# Altium footprint library DrPCB.PcbLib: 910 footprints (part 51 of 57)
Each footprint in its own frame and in the unit in brackets; x right, y up, seen from the top. Pads: shape width x height; smd on the part's side, far side on the other; paste and mask are expansions set on the pad; w line width, h text height; cw(c..) or ccw(c..) is an arc to the next point about the centre after c.
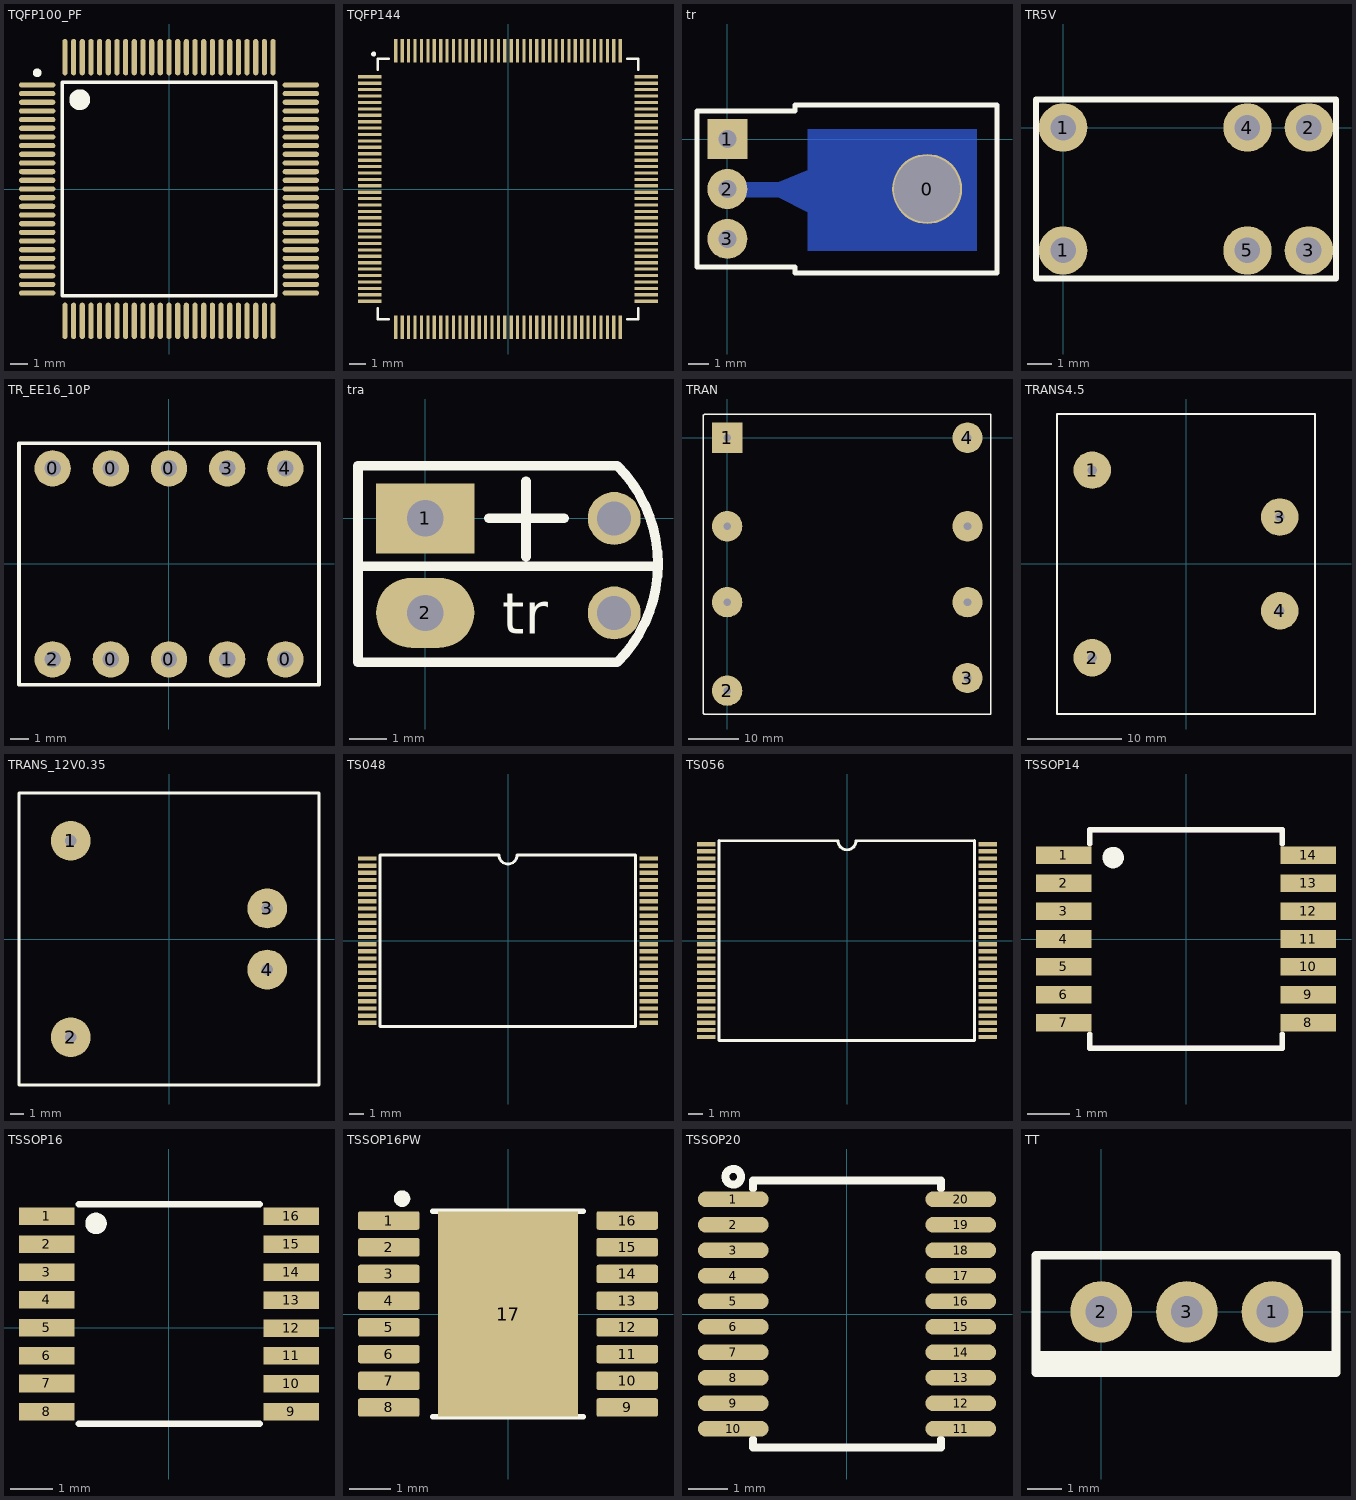
[diagram p50: the footprints below, top view; thin cyan lines are the x and y axes]

## TQFP100_PF [mm]
pads (100):
  oval 2.1x0.3 smd: 1(-7.6,6) 2(-7.6,5.5) 3(-7.6,5) 4(-7.6,4.5) 5(-7.6,4) 6(-7.6,3.5) 7(-7.6,3) 8(-7.6,2.5) 9(-7.6,2) 10(-7.6,1.5) 11(-7.6,1) 12(-7.6,0.5) 13(-7.6,0) 14(-7.6,-0.5) 15(-7.6,-1) 16(-7.6,-1.5) 17(-7.6,-2) 18(-7.6,-2.5) 19(-7.6,-3) 20(-7.6,-3.5) 21(-7.6,-4) 22(-7.6,-4.5) 23(-7.6,-5) 24(-7.6,-5.5) 25(-7.6,-6) 51(7.6,-6) 52(7.6,-5.5) 53(7.6,-5) 54(7.6,-4.5) 55(7.6,-4) 56(7.6,-3.5) 57(7.6,-3) 58(7.6,-2.5) 59(7.6,-2) 60(7.6,-1.5) 61(7.6,-1) 62(7.6,-0.5) 63(7.6,0) 64(7.6,0.5) 65(7.6,1) 66(7.6,1.5) 67(7.6,2) 68(7.6,2.5) 69(7.6,3) 70(7.6,3.5) 71(7.6,4) 72(7.6,4.5) 73(7.6,5) 74(7.6,5.5) 75(7.6,6)
  oval 0.3x2.1 smd: 26(-6,-7.6) 27(-5.5,-7.6) 28(-5,-7.6) 29(-4.5,-7.6) 30(-4,-7.6) 31(-3.5,-7.6) 32(-3,-7.6) 33(-2.5,-7.6) 34(-2,-7.6) 35(-1.5,-7.6) 36(-1,-7.6) 37(-0.5,-7.6) 38(0,-7.6) 39(0.5,-7.6) 40(1,-7.6) 41(1.5,-7.6) 42(2,-7.6) 43(2.5,-7.6) 44(3,-7.6) 45(3.5,-7.6) 46(4,-7.6) 47(4.5,-7.6) 48(5,-7.6) 49(5.5,-7.6) 50(6,-7.6) 76(6,7.6) 77(5.5,7.6) 78(5,7.6) 79(4.5,7.6) 80(4,7.6) 81(3.5,7.6) 82(3,7.6) 83(2.5,7.6) 84(2,7.6) 85(1.5,7.6) 86(1,7.6) 87(0.5,7.6) 88(0,7.6) 89(-0.5,7.6) 90(-1,7.6) 91(-1.5,7.6) 92(-2,7.6) 93(-2.5,7.6) 94(-3,7.6) 95(-3.5,7.6) 96(-4,7.6) 97(-4.5,7.6) 98(-5,7.6) 99(-5.5,7.6) 100(-6,7.6)
Top Overlay:
  circle w0.6: c-5.15,5.15 r0.3
  circle w0.25: c-7.6,6.7 r0.125
  lines w0.2: -6.15,-6.15 6.15,-6.15 6.15,6.15 -6.15,6.15 -6.15,-6.15

## TQFP144 [mil]
pads (144):
  rect 58x7.87 smd: 1(-339.5,275.59) 2(-339.5,259.84) 3(-339.5,244.09) 4(-339.5,228.35) 5(-339.5,212.6) 6(-339.5,196.85) 7(-339.5,181.1) 8(-339.5,165.35) 9(-339.5,149.61) 10(-339.5,133.86) 11(-339.5,118.11) 12(-339.5,102.36) 13(-339.5,86.61) 14(-339.5,70.87) 15(-339.5,55.12) 16(-339.5,39.37) 17(-339.5,23.62) 18(-339.5,7.87) 19(-339.5,-7.87) 20(-339.5,-23.62) 21(-339.5,-39.37) 22(-339.5,-55.12) 23(-339.5,-70.87) 24(-339.5,-86.61) 25(-339.5,-102.36) 26(-339.5,-118.11) 27(-339.5,-133.86) 28(-339.5,-149.61) 29(-339.5,-165.35) 30(-339.5,-181.1) 31(-339.5,-196.85) 32(-339.5,-212.6) 33(-339.5,-228.35) 34(-339.5,-244.09) 35(-339.5,-259.84) 36(-339.5,-275.59) 73(339.5,-275.59) 74(339.5,-259.84) 75(339.5,-244.09) 76(339.5,-228.35) 77(339.5,-212.6) 78(339.5,-196.85) 79(339.5,-181.1) 80(339.5,-165.35) 81(339.5,-149.61) 82(339.5,-133.86) 83(339.5,-118.11) 84(339.5,-102.36) 85(339.5,-86.61) 86(339.5,-70.87) 87(339.5,-55.12) 88(339.5,-39.37) 89(339.5,-23.62) 90(339.5,-7.87) 91(339.5,7.87) 92(339.5,23.62) 93(339.5,39.37) 94(339.5,55.12) 95(339.5,70.87) 96(339.5,86.61) 97(339.5,102.36) 98(339.5,118.11) 99(339.5,133.86) 100(339.5,149.61) 101(339.5,165.35) 102(339.5,181.1) 103(339.5,196.85) 104(339.5,212.6) 105(339.5,228.35) 106(339.5,244.09) 107(339.5,259.84) 108(339.5,275.59)
  rect 7.87x58 smd: 37(-275.59,-339.5) 38(-259.84,-339.5) 39(-244.09,-339.5) 40(-228.35,-339.5) 41(-212.6,-339.5) 42(-196.85,-339.5) 43(-181.1,-339.5) 44(-165.35,-339.5) 45(-149.61,-339.5) 46(-133.86,-339.5) 47(-118.11,-339.5) 48(-102.36,-339.5) 49(-86.61,-339.5) 50(-70.87,-339.5) 51(-55.12,-339.5) 52(-39.37,-339.5) 53(-23.62,-339.5) 54(-7.87,-339.5) 55(7.87,-339.5) 56(23.62,-339.5) 57(39.37,-339.5) 58(55.12,-339.5) 59(70.87,-339.5) 60(86.61,-339.5) 61(102.36,-339.5) 62(118.11,-339.5) 63(133.86,-339.5) 64(149.61,-339.5) 65(165.35,-339.5) 66(181.1,-339.5) 67(196.85,-339.5) 68(212.6,-339.5) 69(228.35,-339.5) 70(244.09,-339.5) 71(259.84,-339.5) 72(275.59,-339.5) 109(275.59,339.5) 110(259.84,339.5) 111(244.09,339.5) 112(228.35,339.5) 113(212.6,339.5) 114(196.85,339.5) 115(181.1,339.5) 116(165.35,339.5) 117(149.61,339.5) 118(133.86,339.5) 119(118.11,339.5) 120(102.36,339.5) 121(86.61,339.5) 122(70.87,339.5) 123(55.12,339.5) 124(39.37,339.5) 125(23.62,339.5) 126(7.87,339.5) 127(-7.87,339.5) 128(-23.62,339.5) 129(-39.37,339.5) 130(-55.12,339.5) 131(-70.87,339.5) 132(-86.61,339.5) 133(-102.36,339.5) 134(-118.11,339.5) 135(-133.86,339.5) 136(-149.61,339.5) 137(-165.35,339.5) 138(-181.1,339.5) 139(-196.85,339.5) 140(-212.6,339.5) 141(-228.35,339.5) 142(-244.09,339.5) 143(-259.84,339.5) 144(-275.59,339.5)
Top Overlay:
  circle w10: c-330,331.5 r1.12
  lines w6: -320,-293.19 -320,-320 -293.19,-320 ; -320,293.19 -320,320 -293.19,320 ; 293.19,-320 320,-320 320,-293.19 ; 293.19,320 320,320 320,293.19
3D body "User Library-TQFP144-0_4.STEP": height 47.24, standoff 0, extent -354.33,-354.33 354.33,354.33

## tr [mm]
pads (4):
  round 3.5 hole 3.3: 0(10,-2.5)
  rect 2x2 hole 0.9: 1(0,0)
  round 2 hole 0.9: 2(0,-2.5) 3(0,-5)
Bottom Layer:
  rectangle: 4,-5.6 12.5,0.5
  region: 4.064,-1.524 2.54,-2.159 0,-2.159 0,-2.921 2.54,-2.921 4.064,-3.683
Top Overlay:
  lines w0.254: -1.524,-6.397 -1.524,1.397 3.38,1.397 3.38,1.7 13.5,1.7 13.5,-6.7 3.38,-6.7 3.38,-6.397 -1.477,-6.397

## TR5V [mm]
pads (6):
  round 2 hole 1.05: 1(0,-5.08) 1(0,0) 2(10.16,0) 3(10.16,-5.08) 4(7.62,0) 5(7.62,-5.08)
Top Overlay:
  lines w0.254: -1.12,-6.24 -1.12,1.16 11.28,1.16 11.28,-6.24 -1.12,-6.24

## TR_EE16_10P [mm]
pads (10):
  round 2 hole 0.9: 0(-6.4,5.25) 0(-3.2,-5.25) 0(-3.2,5.25) 0(0,-5.25) 0(0,5.25) 0(6.4,-5.25) 1(3.2,-5.25) 2(-6.4,-5.25) 3(3.2,5.25) 4(6.4,5.25)
Top Overlay:
  lines w0.2: -8.25,-6.642 -8.25,6.629 8.25,6.629 8.25,-6.642 -8.25,-6.642
3D body "User Library-EE16(5+5).step": height 14.95, standoff -3.6, extent -8.1,-6.462 8.1,6.462

## tra [mm]
pads (4):
  rect 2.6x1.85 hole 0.96: 1(0,0)
  oval 2.6x1.85 hole 0.96: 2(0,-2.5)
  round 1.4 hole 0.9: ""(5,-2.5) ""(5,0)
Top Overlay:
  lines w0.254: -1.778,-1.27 6.096,-1.27 ; 1.683,0 3.683,0 ; 2.667,-1.016 2.667,0.984 ; -1.778,-3.81 -1.778,1.397 5.08,1.397 cw(c2.476,-1.206) 5.08,-3.81 -1.778,-3.81
  text "tr" at 2.032,-3.048 h1.1

## TRAN [mm]
pads (8):
  rect 6x6 hole 1.5: 1(0,0)
  round 6 hole 1.5: 2(0,-50) 3(47.5,-47.5) 4(47.5,0) ""(0,-32.5) ""(0,-17.5) ""(47.5,-32.5) ""(47.5,-17.5)
Top Overlay:
  lines w0.254: -4.699,-54.483 -4.699,4.445 -4.445,4.699 52.07,4.699 52.07,-54.61 -4.572,-54.61 -4.699,-54.483

## TRANS4.5 [mm]
pads (4):
  round 4 hole 1: 1(-10,10) 2(-10,-10) 3(10,5) 4(10,-5)
Top Overlay:
  lines w0.254: -13.75,-16 -13.75,15.982 13.75,15.982 13.75,-16 -13.683,-16

## TRANS_12V0.35 [mm]
pads (4):
  round 3 hole 0.85: 1(-7.4,7.4) 2(-7.4,-7.4) 3(7.4,2.3) 4(7.4,-2.3)
Top Overlay:
  lines w0.254: 11.29,-11 -11.3,-11 -11.3,11 11.29,11 ; 11.3,-11 11.3,11
3D body "70904490.stp": height 19, standoff -5, extent -11.3,-10.85 11.3,10.85

## TS048 [mm]
pads (48):
  rect 1.3x0.3 smd: 1(-9.85,5.75) 2(-9.85,5.25) 3(-9.85,4.75) 4(-9.85,4.25) 5(-9.85,3.75) 6(-9.85,3.25) 7(-9.85,2.75) 8(-9.85,2.25) 9(-9.85,1.75) 10(-9.85,1.25) 11(-9.85,0.75) 12(-9.85,0.25) 13(-9.85,-0.25) 14(-9.85,-0.75) 15(-9.85,-1.25) 16(-9.85,-1.75) 17(-9.85,-2.25) 18(-9.85,-2.75) 19(-9.85,-3.25) 20(-9.85,-3.75) 21(-9.85,-4.25) 22(-9.85,-4.75) 23(-9.85,-5.25) 24(-9.85,-5.75) 25(9.85,-5.75) 26(9.85,-5.25) 27(9.85,-4.75) 28(9.85,-4.25) 29(9.85,-3.75) 30(9.85,-3.25) 31(9.85,-2.75) 32(9.85,-2.25) 33(9.85,-1.75) 34(9.85,-1.25) 35(9.85,-0.75) 36(9.85,-0.25) 37(9.85,0.25) 38(9.85,0.75) 39(9.85,1.25) 40(9.85,1.75) 41(9.85,2.25) 42(9.85,2.75) 43(9.85,3.25) 44(9.85,3.75) 45(9.85,4.25) 46(9.85,4.75) 47(9.85,5.25) 48(9.85,5.75)
Top Overlay:
  lines w0.2: 8.915,5.999 0.635,5.999 cw(c0,5.999) -0.635,5.999 -8.966,5.999 -8.966,-5.997 8.928,-5.997 8.928,6

## TS056 [mm]
pads (56):
  rect 1.3x0.3 smd: 1(-9.85,6.75) 2(-9.85,6.25) 3(-9.85,5.75) 4(-9.85,5.25) 5(-9.85,4.75) 6(-9.85,4.25) 7(-9.85,3.75) 8(-9.85,3.25) 9(-9.85,2.75) 10(-9.85,2.25) 11(-9.85,1.75) 12(-9.85,1.25) 13(-9.85,0.75) 14(-9.85,0.25) 15(-9.85,-0.25) 16(-9.85,-0.75) 17(-9.85,-1.25) 18(-9.85,-1.75) 19(-9.85,-2.25) 20(-9.85,-2.75) 21(-9.85,-3.25) 22(-9.85,-3.75) 23(-9.85,-4.25) 24(-9.85,-4.75) 25(-9.85,-5.25) 26(-9.85,-5.75) 27(-9.85,-6.25) 28(-9.85,-6.75) 29(9.85,-6.75) 30(9.85,-6.25) 31(9.85,-5.75) 32(9.85,-5.25) 33(9.85,-4.75) 34(9.85,-4.25) 35(9.85,-3.75) 36(9.85,-3.25) 37(9.85,-2.75) 38(9.85,-2.25) 39(9.85,-1.75) 40(9.85,-1.25) 41(9.85,-0.75) 42(9.85,-0.25) 43(9.85,0.25) 44(9.85,0.75) 45(9.85,1.25) 46(9.85,1.75) 47(9.85,2.25) 48(9.85,2.75) 49(9.85,3.25) 50(9.85,3.75) 51(9.85,4.25) 52(9.85,4.75) 53(9.85,5.25) 54(9.85,5.75) 55(9.85,6.25) 56(9.85,6.75)
Top Overlay:
  lines w0.2: -8.966,6.999 -0.635,6.999 ccw(c0,6.999) 0.635,6.999 8.915,6.999 ; -8.966,7 -8.966,-7 8.928,-7 8.928,7

## TSSOP14 [mm]
pads (14):
  rect 1.3x0.41 smd: 1(-2.85,1.95) 2(-2.85,1.3) 3(-2.85,0.65) 4(-2.85,0) 5(-2.85,-0.65) 6(-2.85,-1.3) 7(-2.85,-1.95) 8(2.85,-1.95) 9(2.85,-1.3) 10(2.85,-0.65) 11(2.85,0) 12(2.85,0.65) 13(2.85,1.3) 14(2.85,1.95)
Top Overlay:
  circle w0.3: c-1.7,1.9 r0.1
  circle w0.3: c-1.7,1.9 r0.1
  lines w0.127: -2.25,-2.225 -2.25,-2.55 2.25,-2.55 2.25,-2.225 ; -2.25,2.225 -2.25,2.55 2.25,2.55 2.25,2.225
Mechanical 4:
  lines w0.127: -2.25,-2.55 2.25,-2.55 -2.25,-2.55 ; -2.25,2.55 2.25,2.55 -2.25,2.55
3D body "User Library-TSSOP14-1.step": height 1.11, standoff 0.01, extent -3.2,-2.5 3.2,2.5

## TSSOP16 [mm]
pads (16):
  rect 1.3x0.41 smd: 1(-2.85,2.604) 2(-2.85,1.954) 3(-2.85,1.304) 4(-2.85,0.654) 5(-2.85,0.004) 6(-2.85,-0.646) 7(-2.85,-1.296) 8(-2.85,-1.954) 9(2.85,-1.954) 10(2.85,-1.304) 11(2.85,-0.654) 12(2.85,-0.004) 13(2.85,0.646) 14(2.85,1.296) 15(2.85,1.956) 16(2.85,2.604)
Top Overlay:
  circle w0.3: c-1.702,2.438 r0.1
  lines w0.15: -2.108,-2.231 2.121,-2.231 ; -2.108,2.89 2.121,2.89
3D body "User Library-TSSOP-16-1.step": height 1.1, standoff 0, extent -3.2,-2.179 3.2,2.821

## TSSOP16PW [mm]
pads (17):
  rrect25% 1.5x0.45 smd paste-0.09: 1(-2.9,2.275) 2(-2.9,1.625) 3(-2.9,0.975) 4(-2.9,0.325) 5(-2.9,-0.325) 6(-2.9,-0.975) 7(-2.9,-1.625) 8(-2.9,-2.275) 9(2.9,-2.275) 10(2.9,-1.625) 11(2.9,-0.975) 12(2.9,-0.325) 13(2.9,0.325) 14(2.9,0.975) 15(2.9,1.625) 16(2.9,2.275)
  rect 3.4x5 smd paste-3 mask+0: 17(0,0)
Top Overlay:
  circle w0.2: c-2.578,2.807 r0.1
  lines w0.127: -1.83,-2.5 1.83,-2.5 ; -1.83,2.5 1.83,2.5
Top Paste:
  region: 1.23,-1.155 -1.23,-1.155 -1.23,1.155 1.23,1.155
Top Solder:
  region: 1.23,-1.155 -1.23,-1.155 -1.23,1.155 1.23,1.155
3D body "DRV8876PWPR.STEP": height 1.2, standoff 0, extent -3.2,-2.5 3.2,2.5

## TSSOP20 [mm] "PW TSSOP (TI), MO-153-AC (JEDEC), 20Lead, pitch: 0.65mm, 6.5x4.4x1.2mm"
height 1.2
pads (20):
  oval 1.8x0.4 smd mask+0.075: 1(-2.9,2.925) 2(-2.9,2.275) 3(-2.9,1.625) 4(-2.9,0.975) 5(-2.9,0.325) 6(-2.9,-0.325) 7(-2.9,-0.975) 8(-2.9,-1.625) 9(-2.9,-2.275) 10(-2.9,-2.925) 11(2.9,-2.925) 12(2.9,-2.275) 13(2.9,-1.625) 14(2.9,-0.975) 15(2.9,-0.325) 16(2.9,0.325) 17(2.9,0.975) 18(2.9,1.625) 19(2.9,2.275) 20(2.9,2.925)
Top Overlay:
  circle w0.2: c-2.9,3.5 r0.2
  lines w0.2: -2.4,-3.2 -2.4,-3.4 2.4,-3.4 2.4,-3.2 ; -2.4,3.2 -2.4,3.4 2.4,3.4 2.4,3.2
3D body "User Library-TSSOP-20-2.STEP": height 1.2, standoff 0, extent -3.2,-3.25 3.2,3.25

## TT [mm]
pads (3):
  round 1.8 hole 0.93: 1(5,0) 2(0,0) 3(2.5,0)
Top Overlay:
  lines w0.254: -1.905,-1.524 6.858,-1.524 6.858,-1.27 -1.905,-1.27 ; -1.905,-1.778 6.858,-1.778 6.858,1.651 -1.905,1.651 -1.905,-1.778